# Altium footprint library PIF_PCB_Lib.PcbLib: 112 footprints (part 6 of 7)
Each footprint in its own frame and in the unit in brackets; x right, y up, seen from the top. Pads: shape width x height; smd on the part's side, far side on the other; paste and mask are expansions set on the pad; w line width, h text height; cw(c..) or ccw(c..) is an arc to the next point about the centre after c.
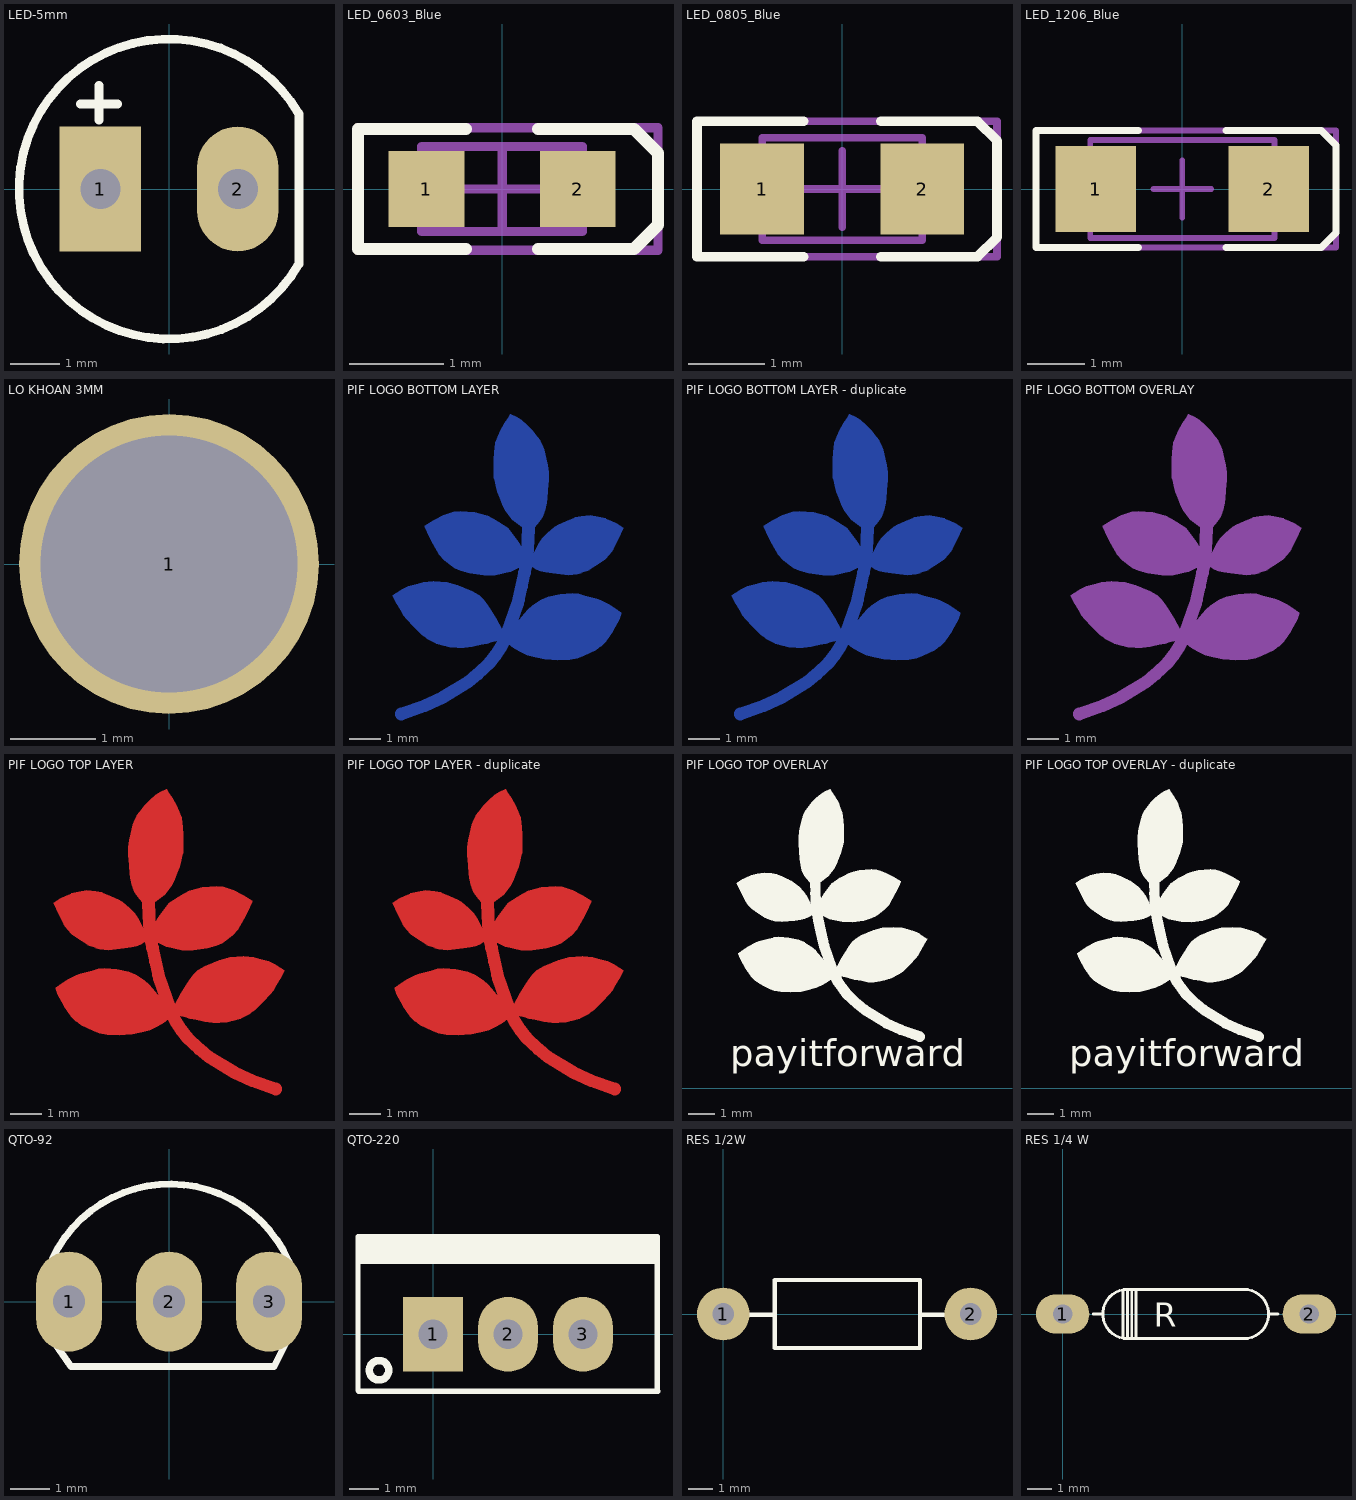
[diagram p5: the footprints below, top view; thin cyan lines are the x and y axes]

## LED-5mm [mil] "LED 2 PIN, 5 ly , Only colour, pin to pin 110mil"
height 300
pads (2):
  rect 65x100 hole 32: 1(-55,0)
  oval 65x100 hole 32: 2(55,0)
Top Overlay:
  lines w7: -71,68 -41,68 ; -56,55 -56,83 ; 103.51,60.71 ccw(c0,0) 103.94,-59.97 ; 104,-59 104,60
3D body "User Library-LEDd5B.STEP": height 339.18, standoff -243.49, extent -113.31,-120.49 100.08,116.5

## LED_0603_Blue [mm] "Chip LED, 2-Leads, Body 1.6x0.8mm, IPC Medium Density"
height 0.68
pads (2):
  rect 0.8x0.8 smd: 1(-0.8,0) 2(0.8,0)
Top Overlay:
  lines w0.127: -0.381,-0.635 -1.524,-0.635 -1.524,0.635 -0.381,0.635 ; 0.381,-0.635 1.397,-0.635 1.651,-0.381 1.651,0.381 1.397,0.635 0.381,0.635
Mechanical 13:
  lines w0.1: -0.85,-0.45 -0.85,0.45 0.85,0.45 0.85,-0.45 -0.85,-0.45
Mechanical 15:
  lines w0.1: -0.45,0 0.45,0 ; 0,-0.45 0,0.45 ; -1.525,-0.65 -1.525,0.65 1.651,0.65 1.651,-0.65 -1.525,-0.65
3D body "WL-SMCW_0603_LED.stp": height 0.7, standoff 0, extent -0.8,-0.4 0.8,0.4

## LED_0805_Blue [mm] "Chip LED, 2-Leads, Body 2.0x1.3mm, IPC Medium Density"
height 0.8
pads (2):
  rect 1.1x1.2 smd: 1(-1.05,0) 2(1.05,0)
Top Overlay:
  lines w0.127: -0.508,-0.889 -1.905,-0.889 -1.905,0.889 -0.508,0.889 ; 0.508,-0.889 1.778,-0.889 2.032,-0.635 2.032,0.635 1.778,0.889 0.508,0.889
Mechanical 13:
  lines w0.1: -1.05,-0.675 -1.05,0.675 1.05,0.675 1.05,-0.675 -1.05,-0.675
Mechanical 15:
  lines w0.1: -0.5,0 0.5,0 ; 0,-0.5 0,0.5 ; -1.905,-0.889 -1.905,0.889 2.032,0.889 2.032,-0.889 -1.905,-0.889
3D body "WL-SMCW_0805_LED.stp": height 0.68, standoff -0.02, extent -1,-0.625 1,0.625

## LED_1206_Blue [mm] "Chip LED, 2-Leads, Body 3.2x1.6mm, IPC Medium Density"
height 0.69
pads (2):
  rect 1.4x1.5 smd: 1(-1.5,0) 2(1.5,0)
Top Overlay:
  lines w0.127: -0.762,-1.016 -2.54,-1.016 -2.54,1.016 -0.762,1.016 ; 0.762,-1.016 2.413,-1.016 2.667,-0.762 2.667,0.762 2.413,1.016 0.762,1.016
Mechanical 13:
  lines w0.1: -1.6,-0.85 -1.6,0.85 1.6,0.85 1.6,-0.85 -1.6,-0.85
Mechanical 15:
  lines w0.1: -0.5,0 0.5,0 ; 0,-0.5 0,0.5 ; -2.54,-1.016 -2.54,1.016 2.667,1.016 2.667,-1.016 -2.54,-1.016
3D body "WL-SMCW_1206_LED.stp": height 0.68, standoff 0, extent -1.6,-0.8 1.6,0.8

## LO KHOAN 3MM [mil]
pads (1):
  round 138 hole 118.1: 1(0,0)

## PIF LOGO BOTTOM LAYER [mil]
Bottom Layer:
  region: 262.8,459.42 263.04,459.41 270.11,456.08 270.14,456.05 270.18,456.04 276.01,452.27 276.04,452.23 276.09,452.21 284.03,445.14 284.04,445.13 290.27,439.3 290.29,439.25 290.35,439.22 296.61,430.88 296.62,430.88 299.95,426.28 299.97,426.21 300.02,426.16 302.92,419.49 302.92,419.48 305.02,414.48 305.02,414.42 305.06,414.37 307.56,403.14 307.56,403.13 309.23,395.2 309.22,395.18 309.23,395.16 310.47,386.42 310.46,386.38 310.47,386.33 310.47,377.17 310.47,377.15 310.47,377.13 309.64,364.19 309.64,364.18 308.81,353.35 308.79,353.32 308.8,353.29 307.96,348.29 307.96,348.28 306.3,339.55 306.28,339.52 306.28,339.48 305.25,336.05 305.22,336.02 305.22,335.98 302.42,329.58 302.37,329.53 302.36,329.47 298.76,324.27 298.73,324.25 298.72,324.21 293.12,317.81 293.05,317.78 293.02,317.72 291.68,316.72 291.74,313.41 291.7,313.32 291.72,313.23 291.62,313.1 291.56,312.96 291.47,312.92 291.41,312.84 291.26,312.82 291.11,312.76 291.02,312.8 290.93,312.78 280.49,315.72 280.42,315.77 280.33,315.79 274.93,319.12 274.91,319.15 274.87,319.16 265.27,326.66 265.23,326.73 265.16,326.78 256.83,337.61 256.81,337.66 256.77,337.69 253.04,344.35 253.04,344.4 253,344.44 249.23,354.44 246.34,361.94 246.34,361.98 246.31,362.01 244.21,370.34 244.21,370.35 242.15,378.68 242.15,378.74 242.13,378.8 241.69,386.3 241.7,386.31 241.69,386.33 241.69,402.17 241.7,402.19 241.7,402.22 242.53,411.79 242.53,411.8 243.8,423.07 243.84,423.14 243.83,423.22 246.73,431.12 246.74,431.13 249.67,438.63 249.71,438.68 249.72,438.73 255.55,448.33 255.57,448.34 255.57,448.36 260.11,454.99 262.19,459.12 262.37,459.28 262.55,459.44 262.56,459.44 262.57,459.44
  region: 166.34,249.76 166.38,249.77 183.45,248.51 183.51,248.48 183.57,248.48 196.91,244.75 196.94,244.72 196.98,244.72 214.91,237.22 214.94,237.19 214.98,237.19 223.72,232.19 223.76,232.13 223.83,232.1 228.83,227.5 228.86,227.44 228.92,227.41 233.09,221.57 233.09,221.56 233.1,221.56 238.1,214.06 238.1,214.05 246.44,201.15 246.44,201.11 246.47,201.09 248.97,196.09 251.91,190.25 251.92,190.1 251.97,189.97 251.97,188.3 251.93,188.19 251.93,188.06 247.03,175.73 246.99,175.69 246.98,175.63 246.92,175.59 246.89,175.51 246.77,175.47 246.69,175.38 246.63,175.38 246.58,175.34 239,173.52 233.59,171.85 233.56,171.86 233.53,171.84 225.63,170.17 225.62,170.17 214.79,168.07 214.78,168.07 205.18,166.4 205.12,166.41 205.07,166.39 195.9,166.39 195.87,166.4 195.84,166.4 186.68,167.23 186.63,167.25 186.59,167.24 179.52,168.91 179.5,168.92 179.49,168.92 169.49,171.85 169.43,171.9 169.36,171.91 158.09,178.14 158.08,178.16 158.05,178.16 152.22,181.93 152.18,181.99 152.11,182.02 140.44,194.09 140.43,194.09 133.37,201.59 133.36,201.61 133.34,201.62 128.74,207.05 128.72,207.12 128.67,207.16 125.34,213.39 118.68,225.05 118.68,225.06 118.67,225.07 115.33,231.33 115.31,231.54 115.27,231.75 115.29,231.78 115.29,231.82 115.42,231.99 115.54,232.16 127.21,240.06 127.27,240.08 127.31,240.12 134.81,243.45 134.85,243.45 134.88,243.48 144.48,246.41 144.49,246.41 144.49,246.42 153.22,248.92 153.29,248.91 153.36,248.94 166.29,249.77
  region: 362.66,332.28 362.74,332.3 372.74,330.63 372.76,330.62 372.78,330.62 381.94,328.52 381.99,328.49 382.06,328.49 388.72,325.59 395.39,322.65 395.44,322.61 395.5,322.59 403.83,316.76 403.94,316.59 404.07,316.44 404.07,316.39 404.1,316.34 404.05,316.15 404.04,315.95 402.38,312.64 399.89,306.43 399.88,306.41 399.87,306.38 396.14,298.88 391.54,289.71 391.49,289.67 391.47,289.6 386.47,283.33 386.46,283.33 386.45,283.32 381.45,277.48 381.39,277.45 381.35,277.38 373.45,271.55 373.43,271.55 373.41,271.53 361.75,264.03 361.68,264.02 361.62,263.97 351.62,260.23 351.6,260.23 351.59,260.22 346.15,258.55 346.08,258.56 346.02,258.53 335.62,257.69 335.56,257.71 335.5,257.7 315.9,259.76 315.89,259.77 315.87,259.77 307.14,261.03 307.11,261.05 307.07,261.05 300.8,262.71 300.79,262.73 300.76,262.73 295.76,264.39 295.71,264.44 295.64,264.45 288.57,268.62 288.52,268.68 288.45,268.71 288.43,268.76 288.38,268.79 288.35,268.91 288.28,269.01 288.29,269.09 288.26,269.17 288.28,269.22 288.27,269.27 290.33,282.17 290.39,282.26 290.4,282.36 297.5,296.13 297.53,296.15 297.53,296.19 302.53,303.69 302.59,303.73 302.61,303.79 309.61,310.79 309.65,310.8 309.66,310.83 318.5,318 318.52,318.01 318.54,318.03 319.53,318.7 319.54,318.7 319.55,318.71 321.58,319.95 321.6,319.95 321.61,319.97 323.7,321.11 323.71,321.11 323.72,321.12 325.86,322.17 325.88,322.17 325.89,322.18 326.97,322.65 334.03,325.98 334.04,325.98 334.06,325.99 343.22,329.76 343.28,329.76 343.34,329.79 351.27,331.46 351.31,331.45 351.35,331.47 362.59,332.31
  region: 340.34,234.82 340.4,234.84 348.33,234 348.38,233.98 348.44,233.98 355.93,231.92 370.92,228.15 370.96,228.13 371.01,228.13 376.01,226.06 376.03,226.04 376.06,226.03 387.3,220.2 387.32,220.17 387.36,220.17 397.36,213.5 397.37,213.47 397.4,213.47 401.57,210.13 401.64,210 401.75,209.89 401.75,209.79 401.8,209.7 401.76,209.56 401.76,209.4 398.86,201.9 398.84,201.87 398.83,201.84 394.23,193.07 394.23,193.06 390.9,186.83 390.87,186.81 390.86,186.77 382.12,174.27 382.08,174.23 382.05,174.18 376.22,168.35 376.16,168.32 376.13,168.27 369.46,163.67 369.42,163.66 369.39,163.63 362.72,160.29 362.71,160.29 353.11,155.72 353.09,155.72 353.09,155.71 347.25,153.21 347.17,153.21 347.11,153.17 337.11,151.5 337.06,151.51 337.02,151.49 322.02,151.06 321.99,151.07 321.97,151.06 306.13,151.89 306.09,151.92 306.04,151.91 293.97,154.41 293.95,154.42 293.92,154.42 283.92,157.35 283.88,157.38 283.83,157.38 273.83,161.95 273.81,161.98 273.77,161.99 266.27,166.59 266.24,166.62 266.21,166.63 260.78,170.79 260.75,170.83 260.71,170.85 260.68,170.94 260.6,171.01 260.59,171.12 260.53,171.22 260.54,171.26 260.53,171.3 260.56,171.39 260.56,171.49 268.49,196.49 268.63,196.66 268.74,196.83 271.17,198.45 280.28,209.21 284.44,214.21 284.49,214.24 284.51,214.28 290.75,219.68 290.79,219.7 290.82,219.74 301.26,226.41 301.3,226.41 301.32,226.44 310.06,230.61 310.14,230.62 310.21,230.66 325.21,233.6 325.25,233.59 325.28,233.6 340.28,234.84
  region: 218.01,336.37 218.07,336.34 218.14,336.35 227.3,333.85 227.31,333.84 227.33,333.84 233.99,331.74 234.04,331.71 234.1,331.7 241.2,327.97 241.27,327.89 247.43,324.63 247.45,324.61 247.48,324.6 259.58,316.67 259.65,316.58 259.74,316.53 271.41,301.53 271.42,301.49 271.45,301.47 279.35,288.57 279.35,288.56 281.85,284.4 281.88,284.18 281.93,283.97 279.87,270.2 279.83,270.15 279.84,270.08 279.74,269.98 279.69,269.85 279.64,269.83 279.61,269.79 279.55,269.77 279.51,269.72 262.84,261.82 262.77,261.82 262.71,261.77 243.94,257.61 243.88,257.62 243.82,257.59 229.25,257.16 229.2,257.18 229.14,257.17 211.64,259.67 211.6,259.69 211.55,259.69 200.29,263.02 200.26,263.04 200.22,263.04 193.15,265.98 193.1,266.03 193.02,266.05 188.02,269.79 188.01,269.79 188,269.8 180.07,276.06 180.05,276.11 180,276.13 173.77,282.8 173.74,282.87 173.68,282.91 163.25,300.81 163.24,300.84 163.22,300.86 158.22,311.29 158.22,311.31 158.21,311.32 155.31,318.39 155.31,318.58 155.27,318.76 155.31,318.82 155.31,318.88 155.44,319.01 155.55,319.17 166.38,326.27 166.42,326.28 166.44,326.3 178.51,332.54 178.56,332.54 178.6,332.57 186.1,335.07 186.11,335.07 186.12,335.08 191.96,336.75 192.01,336.74 192.06,336.77 199.56,337.6 199.62,337.59 199.68,337.61
  lines w15.75: 126.17,83.57 155.2,93.9 177.5,104.07 210,124.07 221.67,133.63 237.07,148.23 244.17,157.4 252.07,169.07 259.17,186.13 271.67,221.57 272.9,226.97 276.67,243.63 280.4,260.73 282.67,270.73 283.5,281.17 284.33,291.57 284.77,300.73 286,334.83
  text "payitforward" at 415,15 h70

## PIF LOGO BOTTOM LAYER - duplicate [mil]
Bottom Layer:
  region: 218.01,336.37 218.07,336.34 218.14,336.35 227.3,333.85 227.31,333.84 227.33,333.84 233.99,331.74 234.04,331.71 234.1,331.7 241.2,327.97 241.27,327.89 247.43,324.63 247.45,324.61 247.48,324.6 259.58,316.67 259.65,316.58 259.74,316.53 271.41,301.53 271.42,301.49 271.45,301.47 279.35,288.57 279.35,288.56 281.85,284.4 281.88,284.18 281.93,283.97 279.87,270.2 279.83,270.15 279.84,270.08 279.74,269.98 279.69,269.85 279.64,269.83 279.61,269.79 279.55,269.77 279.51,269.72 262.84,261.82 262.77,261.82 262.71,261.77 243.94,257.61 243.88,257.62 243.82,257.59 229.25,257.16 229.2,257.18 229.14,257.17 211.64,259.67 211.6,259.69 211.55,259.69 200.29,263.02 200.26,263.04 200.22,263.04 193.15,265.98 193.1,266.03 193.02,266.05 188.02,269.79 188.01,269.79 188,269.8 180.07,276.06 180.05,276.11 180,276.13 173.77,282.8 173.74,282.87 173.68,282.91 163.25,300.81 163.24,300.84 163.22,300.86 158.22,311.29 158.22,311.31 158.21,311.32 155.31,318.39 155.31,318.58 155.27,318.76 155.31,318.82 155.31,318.88 155.44,319.01 155.55,319.17 166.38,326.27 166.42,326.28 166.44,326.3 178.51,332.54 178.56,332.54 178.6,332.57 186.1,335.07 186.11,335.07 186.12,335.08 191.96,336.75 192.01,336.74 192.06,336.77 199.56,337.6 199.62,337.59 199.68,337.61
  region: 340.34,234.82 340.4,234.84 348.33,234 348.38,233.98 348.44,233.98 355.93,231.92 370.92,228.15 370.96,228.13 371.01,228.13 376.01,226.06 376.03,226.04 376.06,226.03 387.3,220.2 387.32,220.17 387.36,220.17 397.36,213.5 397.37,213.47 397.4,213.47 401.57,210.13 401.64,210 401.75,209.89 401.75,209.79 401.8,209.7 401.76,209.56 401.76,209.4 398.86,201.9 398.84,201.87 398.83,201.84 394.23,193.07 394.23,193.06 390.9,186.83 390.87,186.81 390.86,186.77 382.12,174.27 382.08,174.23 382.05,174.18 376.22,168.35 376.16,168.32 376.13,168.27 369.46,163.67 369.42,163.66 369.39,163.63 362.72,160.29 362.71,160.29 353.11,155.72 353.09,155.72 353.09,155.71 347.25,153.21 347.17,153.21 347.11,153.17 337.11,151.5 337.06,151.51 337.02,151.49 322.02,151.06 321.99,151.07 321.97,151.06 306.13,151.89 306.09,151.92 306.04,151.91 293.97,154.41 293.95,154.42 293.92,154.42 283.92,157.35 283.88,157.38 283.83,157.38 273.83,161.95 273.81,161.98 273.77,161.99 266.27,166.59 266.24,166.62 266.21,166.63 260.78,170.79 260.75,170.83 260.71,170.85 260.68,170.94 260.6,171.01 260.59,171.12 260.53,171.22 260.54,171.26 260.53,171.3 260.56,171.39 260.56,171.49 268.49,196.49 268.63,196.66 268.74,196.83 271.17,198.45 280.28,209.21 284.44,214.21 284.49,214.24 284.51,214.28 290.75,219.68 290.79,219.7 290.82,219.74 301.26,226.41 301.3,226.41 301.32,226.44 310.06,230.61 310.14,230.62 310.21,230.66 325.21,233.6 325.25,233.59 325.28,233.6 340.28,234.84
  region: 362.66,332.28 362.74,332.3 372.74,330.63 372.76,330.62 372.78,330.62 381.94,328.52 381.99,328.49 382.06,328.49 388.72,325.59 395.39,322.65 395.44,322.61 395.5,322.59 403.83,316.76 403.94,316.59 404.07,316.44 404.07,316.39 404.1,316.34 404.05,316.15 404.04,315.95 402.38,312.64 399.89,306.43 399.88,306.41 399.87,306.38 396.14,298.88 391.54,289.71 391.49,289.67 391.47,289.6 386.47,283.33 386.46,283.33 386.45,283.32 381.45,277.48 381.39,277.45 381.35,277.38 373.45,271.55 373.43,271.55 373.41,271.53 361.75,264.03 361.68,264.02 361.62,263.97 351.62,260.23 351.6,260.23 351.59,260.22 346.15,258.55 346.08,258.56 346.02,258.53 335.62,257.69 335.56,257.71 335.5,257.7 315.9,259.76 315.89,259.77 315.87,259.77 307.14,261.03 307.11,261.05 307.07,261.05 300.8,262.71 300.79,262.73 300.76,262.73 295.76,264.39 295.71,264.44 295.64,264.45 288.57,268.62 288.52,268.68 288.45,268.71 288.43,268.76 288.38,268.79 288.35,268.91 288.28,269.01 288.29,269.09 288.26,269.17 288.28,269.22 288.27,269.27 290.33,282.17 290.39,282.26 290.4,282.36 297.5,296.13 297.53,296.15 297.53,296.19 302.53,303.69 302.59,303.73 302.61,303.79 309.61,310.79 309.65,310.8 309.66,310.83 318.5,318 318.52,318.01 318.54,318.03 319.53,318.7 319.54,318.7 319.55,318.71 321.58,319.95 321.6,319.95 321.61,319.97 323.7,321.11 323.71,321.11 323.72,321.12 325.86,322.17 325.88,322.17 325.89,322.18 326.97,322.65 334.03,325.98 334.04,325.98 334.06,325.99 343.22,329.76 343.28,329.76 343.34,329.79 351.27,331.46 351.31,331.45 351.35,331.47 362.59,332.31
  region: 166.34,249.76 166.38,249.77 183.45,248.51 183.51,248.48 183.57,248.48 196.91,244.75 196.94,244.72 196.98,244.72 214.91,237.22 214.94,237.19 214.98,237.19 223.72,232.19 223.76,232.13 223.83,232.1 228.83,227.5 228.86,227.44 228.92,227.41 233.09,221.57 233.09,221.56 233.1,221.56 238.1,214.06 238.1,214.05 246.44,201.15 246.44,201.11 246.47,201.09 248.97,196.09 251.91,190.25 251.92,190.1 251.97,189.97 251.97,188.3 251.93,188.19 251.93,188.06 247.03,175.73 246.99,175.69 246.98,175.63 246.92,175.59 246.89,175.51 246.77,175.47 246.69,175.38 246.63,175.38 246.58,175.34 239,173.52 233.59,171.85 233.56,171.86 233.53,171.84 225.63,170.17 225.62,170.17 214.79,168.07 214.78,168.07 205.18,166.4 205.12,166.41 205.07,166.39 195.9,166.39 195.87,166.4 195.84,166.4 186.68,167.23 186.63,167.25 186.59,167.24 179.52,168.91 179.5,168.92 179.49,168.92 169.49,171.85 169.43,171.9 169.36,171.91 158.09,178.14 158.08,178.16 158.05,178.16 152.22,181.93 152.18,181.99 152.11,182.02 140.44,194.09 140.43,194.09 133.37,201.59 133.36,201.61 133.34,201.62 128.74,207.05 128.72,207.12 128.67,207.16 125.34,213.39 118.68,225.05 118.68,225.06 118.67,225.07 115.33,231.33 115.31,231.54 115.27,231.75 115.29,231.78 115.29,231.82 115.42,231.99 115.54,232.16 127.21,240.06 127.27,240.08 127.31,240.12 134.81,243.45 134.85,243.45 134.88,243.48 144.48,246.41 144.49,246.41 144.49,246.42 153.22,248.92 153.29,248.91 153.36,248.94 166.29,249.77
  region: 262.8,459.42 263.04,459.41 270.11,456.08 270.14,456.05 270.18,456.04 276.01,452.27 276.04,452.23 276.09,452.21 284.03,445.14 284.04,445.13 290.27,439.3 290.29,439.25 290.35,439.22 296.61,430.88 296.62,430.88 299.95,426.28 299.97,426.21 300.02,426.16 302.92,419.49 302.92,419.48 305.02,414.48 305.02,414.42 305.06,414.37 307.56,403.14 307.56,403.13 309.23,395.2 309.22,395.18 309.23,395.16 310.47,386.42 310.46,386.38 310.47,386.33 310.47,377.17 310.47,377.15 310.47,377.13 309.64,364.19 309.64,364.18 308.81,353.35 308.79,353.32 308.8,353.29 307.96,348.29 307.96,348.28 306.3,339.55 306.28,339.52 306.28,339.48 305.25,336.05 305.22,336.02 305.22,335.98 302.42,329.58 302.37,329.53 302.36,329.47 298.76,324.27 298.73,324.25 298.72,324.21 293.12,317.81 293.05,317.78 293.02,317.72 291.68,316.72 291.74,313.41 291.7,313.32 291.72,313.23 291.62,313.1 291.56,312.96 291.47,312.92 291.41,312.84 291.26,312.82 291.11,312.76 291.02,312.8 290.93,312.78 280.49,315.72 280.42,315.77 280.33,315.79 274.93,319.12 274.91,319.15 274.87,319.16 265.27,326.66 265.23,326.73 265.16,326.78 256.83,337.61 256.81,337.66 256.77,337.69 253.04,344.35 253.04,344.4 253,344.44 249.23,354.44 246.34,361.94 246.34,361.98 246.31,362.01 244.21,370.34 244.21,370.35 242.15,378.68 242.15,378.74 242.13,378.8 241.69,386.3 241.7,386.31 241.69,386.33 241.69,402.17 241.7,402.19 241.7,402.22 242.53,411.79 242.53,411.8 243.8,423.07 243.84,423.14 243.83,423.22 246.73,431.12 246.74,431.13 249.67,438.63 249.71,438.68 249.72,438.73 255.55,448.33 255.57,448.34 255.57,448.36 260.11,454.99 262.19,459.12 262.37,459.28 262.55,459.44 262.56,459.44 262.57,459.44
  lines w15.75: 126.17,83.57 155.2,93.9 177.5,104.07 210,124.07 221.67,133.63 237.07,148.23 244.17,157.4 252.07,169.07 259.17,186.13 271.67,221.57 272.9,226.97 276.67,243.63 280.4,260.73 282.67,270.73 283.5,281.17 284.33,291.57 284.77,300.73 286,334.83
  text "payitforward" at 415,15 h70

## PIF LOGO BOTTOM OVERLAY [mil]
Bottom Overlay:
  drawing of 22 lines, arcs and shapes, not listed
  text "payitforward" at 415,15 h70

## PIF LOGO TOP LAYER [mil]
Top Layer:
  region: 174.03,229.82 173.97,229.84 166.03,229 165.99,228.98 165.93,228.98 158.44,226.92 143.45,223.15 143.41,223.13 143.36,223.13 138.36,221.06 138.34,221.04 138.31,221.03 127.07,215.2 127.05,215.17 127.01,215.17 117.01,208.5 117,208.47 116.97,208.47 112.8,205.13 112.73,205 112.62,204.89 112.61,204.79 112.57,204.7 112.61,204.56 112.6,204.4 115.5,196.9 115.53,196.87 115.53,196.84 120.13,188.07 120.14,188.07 120.14,188.06 123.47,181.83 123.5,181.81 123.51,181.77 132.24,169.27 132.29,169.23 132.32,169.18 138.15,163.35 138.21,163.32 138.24,163.27 144.9,158.67 144.95,158.66 144.98,158.63 151.65,155.29 151.66,155.29 161.26,150.72 161.27,150.72 161.28,150.71 167.12,148.21 167.2,148.21 167.26,148.17 177.26,146.5 177.31,146.51 177.35,146.49 192.35,146.06 192.38,146.07 192.4,146.06 208.24,146.89 208.28,146.92 208.33,146.91 220.4,149.41 220.42,149.42 220.45,149.42 230.45,152.35 230.49,152.38 230.53,152.38 240.53,156.95 240.56,156.98 240.6,156.99 248.1,161.59 248.12,161.62 248.16,161.63 253.59,165.79 253.61,165.83 253.65,165.85 253.69,165.94 253.77,166.01 253.78,166.12 253.84,166.22 253.83,166.26 253.84,166.3 253.8,166.39 253.81,166.49 245.88,191.49 245.74,191.66 245.62,191.83 243.2,193.45 234.09,204.21 229.93,209.21 229.88,209.24 229.85,209.28 223.62,214.68 223.57,214.7 223.55,214.74 213.11,221.41 213.07,221.41 213.04,221.44 204.31,225.61 204.23,225.62 204.16,225.66 189.16,228.6 189.12,228.59 189.09,228.6 174.09,229.84
  region: 251.57,454.42 251.33,454.41 244.26,451.08 244.23,451.05 244.19,451.04 238.35,447.27 238.32,447.23 238.28,447.21 230.34,440.14 230.33,440.13 224.1,434.3 224.07,434.25 224.02,434.22 217.76,425.88 217.75,425.88 214.42,421.28 214.4,421.21 214.35,421.16 211.45,414.49 211.45,414.48 211.44,414.48 209.34,409.48 209.34,409.42 209.31,409.37 206.81,398.14 206.81,398.13 205.14,390.2 205.15,390.18 205.13,390.16 203.9,381.42 203.91,381.38 203.89,381.33 203.89,372.17 203.9,372.15 203.9,372.13 204.73,359.19 204.73,359.18 205.56,348.35 205.58,348.32 205.57,348.29 206.4,343.29 206.41,343.29 206.41,343.28 208.07,334.55 208.09,334.52 208.09,334.48 209.12,331.05 209.15,331.02 209.15,330.98 211.95,324.58 212,324.53 212.01,324.47 215.61,319.27 215.64,319.25 215.65,319.21 221.25,312.81 221.32,312.78 221.35,312.72 222.69,311.72 222.63,308.41 222.66,308.32 222.65,308.23 222.75,308.1 222.81,307.96 222.9,307.92 222.96,307.84 223.11,307.82 223.26,307.76 223.35,307.8 223.44,307.78 233.88,310.72 233.95,310.77 234.04,310.79 239.44,314.12 239.46,314.15 239.5,314.16 249.1,321.66 249.14,321.73 249.21,321.78 257.54,332.61 257.56,332.66 257.59,332.69 261.33,339.35 261.33,339.4 261.37,339.44 265.13,349.44 268.03,356.94 268.03,356.98 268.06,357.01 270.16,365.34 270.16,365.35 272.22,373.68 272.21,373.74 272.24,373.8 272.67,381.3 272.67,381.31 272.68,381.33 272.68,397.17 272.66,397.19 272.67,397.22 271.84,406.79 271.84,406.8 270.57,418.07 270.53,418.14 270.54,418.22 267.64,426.12 267.63,426.13 264.7,433.63 264.66,433.68 264.65,433.73 258.82,443.33 258.8,443.34 258.8,443.36 254.25,449.99 252.17,454.12 252,454.28 251.82,454.44 251.81,454.44 251.8,454.44
  region: 151.71,327.28 151.63,327.3 141.63,325.63 141.61,325.62 141.59,325.62 132.43,323.52 132.38,323.49 132.31,323.49 125.65,320.59 125.64,320.59 118.98,317.65 118.93,317.61 118.87,317.59 110.53,311.76 110.43,311.59 110.29,311.44 110.3,311.39 110.27,311.34 110.31,311.15 110.33,310.95 111.98,307.64 114.47,301.43 114.49,301.41 114.5,301.38 118.23,293.88 122.83,284.71 122.88,284.67 122.9,284.6 127.9,278.33 127.91,278.33 127.92,278.32 132.92,272.48 132.98,272.45 133.02,272.38 140.92,266.55 140.94,266.55 140.96,266.53 152.62,259.03 152.69,259.02 152.74,258.97 162.74,255.23 162.76,255.23 162.78,255.22 168.21,253.55 168.29,253.56 168.35,253.53 178.75,252.69 178.81,252.71 178.87,252.7 198.47,254.76 198.48,254.77 198.49,254.77 207.23,256.03 207.26,256.05 207.3,256.05 213.57,257.71 213.58,257.73 213.6,257.73 218.6,259.39 218.66,259.44 218.73,259.45 225.79,263.62 225.84,263.68 225.92,263.71 225.94,263.76 225.99,263.79 226.02,263.91 226.09,264.01 226.08,264.09 226.11,264.17 226.09,264.22 226.1,264.27 224.03,277.17 223.98,277.26 223.97,277.36 216.87,291.13 216.84,291.15 216.83,291.19 211.83,298.69 211.78,298.73 211.75,298.79 204.75,305.79 204.72,305.8 204.71,305.83 195.87,313 195.84,313.01 195.83,313.03 194.84,313.7 194.83,313.7 194.82,313.71 192.79,314.95 192.77,314.95 192.76,314.97 190.67,316.11 190.66,316.11 190.65,316.12 188.51,317.17 188.49,317.17 188.48,317.18 187.4,317.65 180.34,320.98 180.32,320.98 180.31,320.99 171.15,324.76 171.08,324.76 171.03,324.79 163.1,326.46 163.06,326.45 163.02,326.47 151.78,327.31
  region: 348.03,244.76 347.99,244.77 330.92,243.51 330.86,243.48 330.8,243.48 317.46,239.75 317.43,239.72 317.39,239.72 299.45,232.22 299.43,232.19 299.38,232.19 290.65,227.19 290.6,227.13 290.53,227.1 285.53,222.5 285.51,222.44 285.45,222.41 281.28,216.57 281.28,216.56 281.27,216.56 276.27,209.06 276.27,209.05 276.26,209.05 267.93,196.15 267.92,196.11 267.9,196.09 265.4,191.09 262.46,185.25 262.45,185.1 262.39,184.97 262.39,183.3 262.44,183.19 262.44,183.06 267.34,170.73 267.38,170.69 267.39,170.63 267.45,170.59 267.48,170.51 267.6,170.47 267.68,170.38 267.74,170.38 267.78,170.34 275.37,168.52 280.78,166.85 280.81,166.86 280.84,166.84 288.74,165.17 288.75,165.17 299.58,163.07 299.59,163.07 309.19,161.4 309.25,161.41 309.3,161.39 318.47,161.39 318.5,161.4 318.53,161.4 327.69,162.23 327.74,162.25 327.78,162.24 334.85,163.91 334.86,163.92 334.88,163.92 344.88,166.85 344.94,166.9 345.01,166.91 356.28,173.14 356.29,173.16 356.32,173.16 362.15,176.93 362.19,176.99 362.26,177.02 373.93,189.09 381,196.59 381.01,196.61 381.02,196.62 385.62,202.05 385.65,202.12 385.7,202.16 389.03,208.39 395.69,220.05 395.69,220.06 395.7,220.07 399.03,226.33 399.05,226.54 399.1,226.75 399.08,226.78 399.08,226.82 398.94,226.99 398.83,227.16 387.16,235.06 387.1,235.08 387.06,235.12 379.56,238.45 379.52,238.45 379.49,238.48 369.89,241.41 369.88,241.41 369.88,241.42 361.14,243.92 361.07,243.91 361.01,243.94 348.08,244.77
  region: 296.36,331.37 296.3,331.34 296.23,331.35 287.07,328.85 287.06,328.84 287.04,328.84 280.38,326.74 280.33,326.71 280.27,326.7 273.17,322.97 273.1,322.89 266.94,319.63 266.92,319.61 266.88,319.6 254.78,311.67 254.72,311.58 254.63,311.53 242.96,296.53 242.95,296.49 242.92,296.47 235.02,283.57 235.02,283.56 232.52,279.4 232.49,279.18 232.44,278.97 234.5,265.2 234.54,265.15 234.53,265.08 234.63,264.98 234.68,264.85 234.73,264.83 234.75,264.79 234.82,264.77 234.86,264.72 251.53,256.82 251.6,256.82 251.66,256.77 270.43,252.61 270.49,252.62 270.55,252.59 285.12,252.16 285.17,252.18 285.23,252.17 302.73,254.67 302.77,254.69 302.82,254.69 314.08,258.02 314.11,258.04 314.15,258.04 321.21,260.98 321.27,261.03 321.35,261.05 326.35,264.79 326.36,264.79 326.37,264.8 334.3,271.06 334.32,271.11 334.37,271.13 340.6,277.8 340.63,277.87 340.69,277.91 351.12,295.81 351.13,295.84 351.15,295.86 356.15,306.29 356.15,306.31 356.16,306.32 359.06,313.39 359.06,313.58 359.1,313.76 359.06,313.82 359.06,313.88 358.93,314.01 358.82,314.17 347.99,321.27 347.95,321.28 347.93,321.3 335.86,327.54 335.81,327.54 335.77,327.57 328.27,330.07 328.26,330.07 328.24,330.08 322.41,331.75 322.36,331.74 322.31,331.77 314.81,332.6 314.75,332.59 314.69,332.61
  lines w15.75: 228.37,329.83 229.6,295.73 230.04,286.57 230.87,276.17 231.7,265.73 233.97,255.73 237.7,238.63 241.47,221.97 242.7,216.57 255.2,181.13 262.3,164.07 270.2,152.4 277.3,143.23 292.7,128.63 304.37,119.07 336.87,99.07 359.17,88.9 388.2,78.57
  text "payitforward" at 100,20 h70

## PIF LOGO TOP LAYER - duplicate [mil]
Top Layer:
  region: 174.03,229.82 173.97,229.84 166.03,229 165.99,228.98 165.93,228.98 158.44,226.92 143.45,223.15 143.41,223.13 143.36,223.13 138.36,221.06 138.34,221.04 138.31,221.03 127.07,215.2 127.05,215.17 127.01,215.17 117.01,208.5 117,208.47 116.97,208.47 112.8,205.13 112.73,205 112.62,204.89 112.61,204.79 112.57,204.7 112.61,204.56 112.6,204.4 115.5,196.9 115.53,196.87 115.53,196.84 120.13,188.07 120.14,188.07 120.14,188.06 123.47,181.83 123.5,181.81 123.51,181.77 132.24,169.27 132.29,169.23 132.32,169.18 138.15,163.35 138.21,163.32 138.24,163.27 144.9,158.67 144.95,158.66 144.98,158.63 151.65,155.29 151.66,155.29 161.26,150.72 161.27,150.72 161.28,150.71 167.12,148.21 167.2,148.21 167.26,148.17 177.26,146.5 177.31,146.51 177.35,146.49 192.35,146.06 192.38,146.07 192.4,146.06 208.24,146.89 208.28,146.92 208.33,146.91 220.4,149.41 220.42,149.42 220.45,149.42 230.45,152.35 230.49,152.38 230.53,152.38 240.53,156.95 240.56,156.98 240.6,156.99 248.1,161.59 248.12,161.62 248.16,161.63 253.59,165.79 253.61,165.83 253.65,165.85 253.69,165.94 253.77,166.01 253.78,166.12 253.84,166.22 253.83,166.26 253.84,166.3 253.8,166.39 253.81,166.49 245.88,191.49 245.74,191.66 245.62,191.83 243.2,193.45 234.09,204.21 229.93,209.21 229.88,209.24 229.85,209.28 223.62,214.68 223.57,214.7 223.55,214.74 213.11,221.41 213.07,221.41 213.04,221.44 204.31,225.61 204.23,225.62 204.16,225.66 189.16,228.6 189.12,228.59 189.09,228.6 174.09,229.84
  region: 251.57,454.42 251.33,454.41 244.26,451.08 244.23,451.05 244.19,451.04 238.35,447.27 238.32,447.23 238.28,447.21 230.34,440.14 230.33,440.13 224.1,434.3 224.07,434.25 224.02,434.22 217.76,425.88 217.75,425.88 214.42,421.28 214.4,421.21 214.35,421.16 211.45,414.49 211.45,414.48 211.44,414.48 209.34,409.48 209.34,409.42 209.31,409.37 206.81,398.14 206.81,398.13 205.14,390.2 205.15,390.18 205.13,390.16 203.9,381.42 203.91,381.38 203.89,381.33 203.89,372.17 203.9,372.15 203.9,372.13 204.73,359.19 204.73,359.18 205.56,348.35 205.58,348.32 205.57,348.29 206.4,343.29 206.41,343.29 206.41,343.28 208.07,334.55 208.09,334.52 208.09,334.48 209.12,331.05 209.15,331.02 209.15,330.98 211.95,324.58 212,324.53 212.01,324.47 215.61,319.27 215.64,319.25 215.65,319.21 221.25,312.81 221.32,312.78 221.35,312.72 222.69,311.72 222.63,308.41 222.66,308.32 222.65,308.23 222.75,308.1 222.81,307.96 222.9,307.92 222.96,307.84 223.11,307.82 223.26,307.76 223.35,307.8 223.44,307.78 233.88,310.72 233.95,310.77 234.04,310.79 239.44,314.12 239.46,314.15 239.5,314.16 249.1,321.66 249.14,321.73 249.21,321.78 257.54,332.61 257.56,332.66 257.59,332.69 261.33,339.35 261.33,339.4 261.37,339.44 265.13,349.44 268.03,356.94 268.03,356.98 268.06,357.01 270.16,365.34 270.16,365.35 272.22,373.68 272.21,373.74 272.24,373.8 272.67,381.3 272.67,381.31 272.68,381.33 272.68,397.17 272.66,397.19 272.67,397.22 271.84,406.79 271.84,406.8 270.57,418.07 270.53,418.14 270.54,418.22 267.64,426.12 267.63,426.13 264.7,433.63 264.66,433.68 264.65,433.73 258.82,443.33 258.8,443.34 258.8,443.36 254.25,449.99 252.17,454.12 252,454.28 251.82,454.44 251.81,454.44 251.8,454.44
  region: 151.71,327.28 151.63,327.3 141.63,325.63 141.61,325.62 141.59,325.62 132.43,323.52 132.38,323.49 132.31,323.49 125.65,320.59 125.64,320.59 118.98,317.65 118.93,317.61 118.87,317.59 110.53,311.76 110.43,311.59 110.29,311.44 110.3,311.39 110.27,311.34 110.31,311.15 110.33,310.95 111.98,307.64 114.47,301.43 114.49,301.41 114.5,301.38 118.23,293.88 122.83,284.71 122.88,284.67 122.9,284.6 127.9,278.33 127.91,278.33 127.92,278.32 132.92,272.48 132.98,272.45 133.02,272.38 140.92,266.55 140.94,266.55 140.96,266.53 152.62,259.03 152.69,259.02 152.74,258.97 162.74,255.23 162.76,255.23 162.78,255.22 168.21,253.55 168.29,253.56 168.35,253.53 178.75,252.69 178.81,252.71 178.87,252.7 198.47,254.76 198.48,254.77 198.49,254.77 207.23,256.03 207.26,256.05 207.3,256.05 213.57,257.71 213.58,257.73 213.6,257.73 218.6,259.39 218.66,259.44 218.73,259.45 225.79,263.62 225.84,263.68 225.92,263.71 225.94,263.76 225.99,263.79 226.02,263.91 226.09,264.01 226.08,264.09 226.11,264.17 226.09,264.22 226.1,264.27 224.03,277.17 223.98,277.26 223.97,277.36 216.87,291.13 216.84,291.15 216.83,291.19 211.83,298.69 211.78,298.73 211.75,298.79 204.75,305.79 204.72,305.8 204.71,305.83 195.87,313 195.84,313.01 195.83,313.03 194.84,313.7 194.83,313.7 194.82,313.71 192.79,314.95 192.77,314.95 192.76,314.97 190.67,316.11 190.66,316.11 190.65,316.12 188.51,317.17 188.49,317.17 188.48,317.18 187.4,317.65 180.34,320.98 180.32,320.98 180.31,320.99 171.15,324.76 171.08,324.76 171.03,324.79 163.1,326.46 163.06,326.45 163.02,326.47 151.78,327.31
  region: 348.03,244.76 347.99,244.77 330.92,243.51 330.86,243.48 330.8,243.48 317.46,239.75 317.43,239.72 317.39,239.72 299.45,232.22 299.43,232.19 299.38,232.19 290.65,227.19 290.6,227.13 290.53,227.1 285.53,222.5 285.51,222.44 285.45,222.41 281.28,216.57 281.28,216.56 281.27,216.56 276.27,209.06 276.27,209.05 276.26,209.05 267.93,196.15 267.92,196.11 267.9,196.09 265.4,191.09 262.46,185.25 262.45,185.1 262.39,184.97 262.39,183.3 262.44,183.19 262.44,183.06 267.34,170.73 267.38,170.69 267.39,170.63 267.45,170.59 267.48,170.51 267.6,170.47 267.68,170.38 267.74,170.38 267.78,170.34 275.37,168.52 280.78,166.85 280.81,166.86 280.84,166.84 288.74,165.17 288.75,165.17 299.58,163.07 299.59,163.07 309.19,161.4 309.25,161.41 309.3,161.39 318.47,161.39 318.5,161.4 318.53,161.4 327.69,162.23 327.74,162.25 327.78,162.24 334.85,163.91 334.86,163.92 334.88,163.92 344.88,166.85 344.94,166.9 345.01,166.91 356.28,173.14 356.29,173.16 356.32,173.16 362.15,176.93 362.19,176.99 362.26,177.02 373.93,189.09 381,196.59 381.01,196.61 381.02,196.62 385.62,202.05 385.65,202.12 385.7,202.16 389.03,208.39 395.69,220.05 395.69,220.06 395.7,220.07 399.03,226.33 399.05,226.54 399.1,226.75 399.08,226.78 399.08,226.82 398.94,226.99 398.83,227.16 387.16,235.06 387.1,235.08 387.06,235.12 379.56,238.45 379.52,238.45 379.49,238.48 369.89,241.41 369.88,241.41 369.88,241.42 361.14,243.92 361.07,243.91 361.01,243.94 348.08,244.77
  region: 296.36,331.37 296.3,331.34 296.23,331.35 287.07,328.85 287.06,328.84 287.04,328.84 280.38,326.74 280.33,326.71 280.27,326.7 273.17,322.97 273.1,322.89 266.94,319.63 266.92,319.61 266.88,319.6 254.78,311.67 254.72,311.58 254.63,311.53 242.96,296.53 242.95,296.49 242.92,296.47 235.02,283.57 235.02,283.56 232.52,279.4 232.49,279.18 232.44,278.97 234.5,265.2 234.54,265.15 234.53,265.08 234.63,264.98 234.68,264.85 234.73,264.83 234.75,264.79 234.82,264.77 234.86,264.72 251.53,256.82 251.6,256.82 251.66,256.77 270.43,252.61 270.49,252.62 270.55,252.59 285.12,252.16 285.17,252.18 285.23,252.17 302.73,254.67 302.77,254.69 302.82,254.69 314.08,258.02 314.11,258.04 314.15,258.04 321.21,260.98 321.27,261.03 321.35,261.05 326.35,264.79 326.36,264.79 326.37,264.8 334.3,271.06 334.32,271.11 334.37,271.13 340.6,277.8 340.63,277.87 340.69,277.91 351.12,295.81 351.13,295.84 351.15,295.86 356.15,306.29 356.15,306.31 356.16,306.32 359.06,313.39 359.06,313.58 359.1,313.76 359.06,313.82 359.06,313.88 358.93,314.01 358.82,314.17 347.99,321.27 347.95,321.28 347.93,321.3 335.86,327.54 335.81,327.54 335.77,327.57 328.27,330.07 328.26,330.07 328.24,330.08 322.41,331.75 322.36,331.74 322.31,331.77 314.81,332.6 314.75,332.59 314.69,332.61
  lines w15.75: 228.37,329.83 229.6,295.73 230.04,286.57 230.87,276.17 231.7,265.73 233.97,255.73 237.7,238.63 241.47,221.97 242.7,216.57 255.2,181.13 262.3,164.07 270.2,152.4 277.3,143.23 292.7,128.63 304.37,119.07 336.87,99.07 359.17,88.9 388.2,78.57
  text "payitforward" at 100,20 h70

## PIF LOGO TOP OVERLAY [mil]
Top Overlay:
  drawing of 22 lines, arcs and shapes, not listed
  text "payitforward" at 100,20 h70

## PIF LOGO TOP OVERLAY - duplicate [mil]
Top Overlay:
  drawing of 22 lines, arcs and shapes, not listed
  text "payitforward" at 100,20 h70

## QTO-92 [mil] "TO-92"
height 200
pads (3):
  oval 66x100 hole 32: 1(-100,0) 2(0,0) 3(100,0)
Top Overlay:
  lines w7: -116.52,43.21 cw(c0.97,-12.43) 119.94,39.97 ; -115.34,-40.24 -98,-65 105,-65 118,-39
3D body "SW3dPS-TO92.STEP": height 245.04, standoff -199.79, extent -108.87,-65.56 108.86,95

## QTO-220 [mil] "TO-220 - 1-2-3"
height 200
pads (3):
  rect 80x100 hole 39: 1(0,0)
  oval 80x100 hole 39: 2(100,0) 3(200,0)
Top Overlay:
  circle w10: c-72.03,-48 r12.97
  rectangle: -99,94 300,130
  lines w7: 298,107 299,93 ; -100,-75 -100,130 299,130 299,-75 300,-76 -76,-76 -99,-76 -100,-75
3D body "SW3dPS-TO220AB.STEP": height 754.72, standoff -400, extent -119,-64 322.46,120.65

## RES 1/2W [mil] "R 1/2W, 2 pin, 300mil"
height 100
pads (2):
  round 85 hole 35: 1(0,0) 2(400,0)
Top Overlay:
  lines w7: 42,-1 83,-1 ; 318,-1 356,-1 ; 83,-55 83,55 318,55 318,-55 83,-55
3D body "SW3dPS-AXIAL_RESISTOR(0.25W).STEP": height 91.42, standoff -70, extent -11.6,-45.49 413.6,49

## RES 1/4 W [mm]
pads (2):
  oval 2.2x1.6 hole 0.787: 1(0,0) 2(10.16,0)
Top Overlay:
  lines w0.12: 1.257,0 1.651,0 ; 2.489,-0.978 2.489,0.978 ; 2.591,1.016 7.468,1.016 cw(c7.468,0) 7.468,-1.016 2.667,-1.016 cw(c2.667,0) 2.667,1.016 ; 2.68,-1.016 2.667,-1.003 2.667,1.003 2.68,1.016 ; 2.845,-1.016 2.845,1.016 ; 3.023,-1.003 3.023,0.991 ; 8.484,0 8.877,0
  text "R" at 3.746,-0.521 h1
3D body "User Library-RESISTOR, 0_25 W, 0_4 IN LEAD PITCH.step": height 2.93, standoff -2.54, extent -0.305,-1.156 10.465,1.156